# Altium footprint library SVP_Phoenix.PcbLib: 53 footprints (part 3 of 4)
Each footprint in its own frame and in the unit in brackets; x right, y up, seen from the top. Pads: shape width x height; smd on the part's side, far side on the other; paste and mask are expansions set on the pad; w line width, h text height; cw(c..) or ccw(c..) is an arc to the next point about the centre after c.
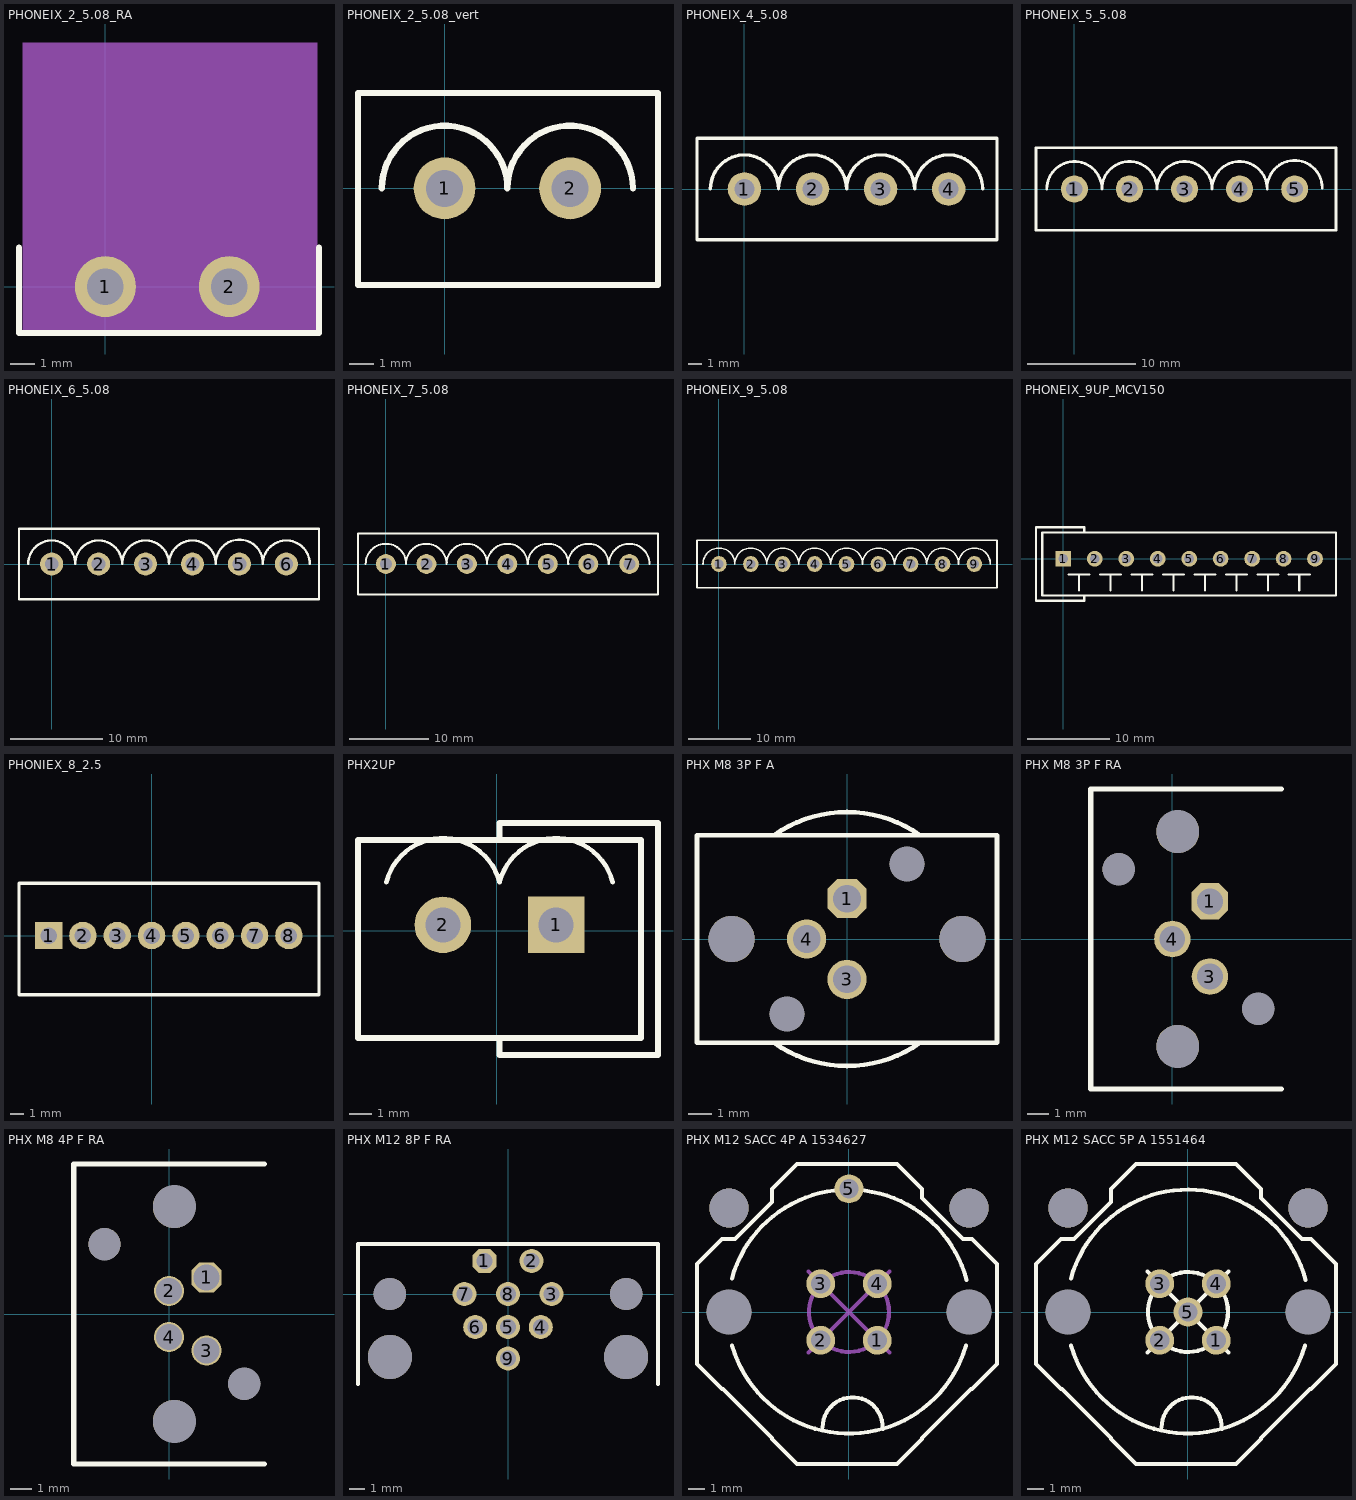
[diagram p2: the footprints below, top view; thin cyan lines are the x and y axes]

## PHONEIX_2_5.08_RA [mm]
height 15
pads (2):
  round 2.5 hole 1.5: 1(0,0) 2(5.08,0)
Top Overlay:
  lines w0.254: -3.54,-1.9 -3.54,1.6 ; -3.5,-1.9 8.7,-1.9 ; 8.76,-1.9 8.76,1.6
Mechanical 1:
  rectangle: -3.4,-2 8.7,10
3D body "1757242.stp": height 8.6, standoff -3.5, extent -3.54,-2.007 8.62,9.996

## PHONEIX_2_5.08_vert [mm]
height 15
pads (2):
  round 2.5 hole 1.5: 1(0,0) 2(5.08,0)
Top Overlay:
  lines w0.254: -2.54,0 cw(c0,0) 2.54,0 cw(c5.08,0) 7.62,0 ; -3.505,-3.912 8.636,-3.912 8.636,3.861 -3.505,3.861 -3.505,-3.912
3D body "1924305.stp": height 12, standoff -3.9, extent -3.515,-4.79 8.645,3.81

## PHONEIX_4_5.08 [mm] "1755752"
height 27.178
pads (4):
  round 2.5 hole 1.5: 1(0,0) 2(5.08,0) 3(10.16,0) 4(15.24,0)
Top Overlay:
  lines w0.254: -2.54,0 cw(c0,0) 2.54,0 cw(c5.08,0) 7.62,0 cw(c10.16,0) 12.7,0 cw(c15.24,0) 17.78,0 ; -3.54,-3.8 -3.54,3.8 18.847,3.8 18.847,-3.8 -3.54,-3.8
3D body "1755752.stp": height 12, standoff -3.9, extent -3.438,-4.815 18.882,3.785

## PHONEIX_5_5.08 [mm]
pads (5):
  round 2.5 hole 1.5: 1(0,0) 2(5.08,0) 3(10.16,0) 4(15.24,0) 5(20.32,0)
Top Overlay:
  lines w0.254: -2.54,0 cw(c0,0) 2.54,0 cw(c5.08,0) 7.62,0 cw(c10.16,0) 12.7,0 cw(c15.24,0) 17.78,0 ; 17.78,0.1 cw(c20.32,0.1) 22.86,0.1 ; -3.54,-3.8 -3.54,3.8 24.13,3.8 24.13,-3.8 -3.54,-3.8
3D body "1755765.stp": height 12, standoff -3.9, extent -3.524,-4.815 23.876,3.785

## PHONEIX_6_5.08 [mm]
pads (6):
  round 2.5 hole 1.5: 1(0,0) 2(5.08,0) 3(10.16,0) 4(15.24,0) 5(20.32,0) 6(25.4,0)
Top Overlay:
  lines w0.254: -2.54,0 cw(c0,0) 2.54,0 cw(c5.08,0) 7.62,0 cw(c10.16,0) 12.7,0 cw(c15.24,0) 17.78,0 ; 17.78,0.1 cw(c20.32,0.1) 22.86,0.1 ; 22.86,0 cw(c25.4,0) 27.94,0 ; -3.54,-3.8 28.94,-3.8 28.94,3.8 -3.54,3.8 -3.54,-3.8
3D body "1755778.stp": height 12, standoff -3.9, extent -3.529,-4.803 28.951,3.797

## PHONEIX_7_5.08 [mm]
pads (7):
  round 2.5 hole 1.5: 1(0,0) 2(5.08,0) 3(10.16,0) 4(15.24,0) 5(20.32,0) 6(25.4,0) 7(30.54,0)
Top Overlay:
  lines w0.254: -2.54,0 cw(c0,0) 2.54,0 ; 2.52,0 cw(c5.06,0) 7.6,0 ; 7.62,0 cw(c10.16,0) 12.7,0 cw(c15.24,0) 17.78,0 ; 17.8,0 cw(c20.34,0) 22.88,0 ; 22.86,0 cw(c25.4,0) 27.94,0 ; 28,0 cw(c30.54,0) 33.08,0 ; -3.5,-1.9 -3.5,-0.95 -3.5,0.95 -3.5,1.9 ; -3.5,-1.9 -3.5,-3.8 34.14,-3.8 34.14,3.8 -3.5,3.8 -3.5,1.9 ; -3.5,-1.9 -3.5,-1.9 ; -3.5,1.9 -3.5,1.9
3D body "1755781.stp": height 12, standoff -3.9, extent -3.56,-4.8 34,3.8

## PHONEIX_9_5.08 [mm]
pads (9):
  round 2.5 hole 1.5: 1(0,0) 2(5.08,0) 3(10.16,0) 4(15.24,0) 5(20.32,0) 6(25.4,0) 7(30.54,0) 8(35.62,0) 9(40.7,0)
Top Overlay:
  lines w0.254: -2.54,0 cw(c0,0) 2.54,0 ; 2.52,0 cw(c5.06,0) 7.6,0 ; 7.62,0 cw(c10.16,0) 12.7,0 cw(c15.24,0) 17.78,0 ; 17.8,0 cw(c20.34,0) 22.88,0 ; 22.86,0 cw(c25.4,0) 27.94,0 ; 28,0 cw(c30.54,0) 33.08,0 ; 33.1,0 cw(c35.64,0) 38.18,0 ; 38.16,0 cw(c40.7,0) 43.24,0 ; -3.5,-1.9 -3.5,-0.95 -3.5,0.95 -3.5,1.9 ; -3.5,-1.9 -3.5,-3.8 44.3,-3.8 44.3,-1.74 44.3,1.74 44.3,3.8 -3.5,3.8 -3.5,1.9 ; -3.5,-1.9 -3.5,-1.9 ; -3.5,1.9 -3.5,1.9
3D body "1755804.stp": height 12, standoff -3.9, extent -3.569,-4.803 44.151,3.797

## PHONEIX_9UP_MCV150 [mil] "9 pin Phoneix conector"
height 100
pads (9):
  rect 75x75 hole 47: 1(0,0)
  round 75 hole 47: 2(150,0) 3(300,0) 4(450,0) 5(600,0) 6(750,0) 7(900,0) 8(1050,0) 9(1200,0)
Top Overlay:
  lines w10: 25,-75 125,-75 ; 75,-150 75,-75 ; 100,-175 100,-200 -130,-200 -130,150 100,150 100,130 ; 175,-75 275,-75 ; 225,-150 225,-75 ; 325,-75 425,-75 ; 375,-150 375,-75 ; 475,-75 575,-75 ; 525,-150 525,-75 ; 625,-75 725,-75 ; 675,-150 675,-75 ; 775,-75 875,-75 ; 825,-150 825,-75 ; 925,-75 1025,-75 ; 975,-150 975,-75 ; 1075,-75 1175,-75 ; 1125,-150 1125,-75 ; -100,-175 -100,125 1300,125 1300,-175 -100,-175

## PHONIEX_8_2.5 [mm]
pads (8):
  rect 2x2 hole 1.2: 1(-7.5,0)
  round 2 hole 1.2: 2(-5,0) 3(-2.5,0) 4(0,0) 5(2.5,0) 6(5,0) 7(7.5,0) 8(10,0)
Top Overlay:
  lines w0.254: -9.652,-4.318 12.192,-4.318 12.192,3.81 -9.652,3.81 -9.652,-4.318
3D body "1881613.stp": height 10.1, standoff -3.5, extent -9.666,-4.29 12.234,3.81

## PHX2UP [mil]
pads (2):
  rect 100x100 hole 62: 1(105,10)
  round 100 hole 62: 2(-95,10)
Top Overlay:
  lines w8: -195.02,84.94 cw(c-95,60) 5.02,84.94 cw(c105,60) 205.02,84.94
  lines w10: 5,-190 5,-220 285,-220 285,190 275,190 5,190 5,160 ; -245,-190 255,-190 255,160 -245,160 -245,-190
3D body "1755736.stp": height 472.44, standoff -153.54, extent -234.37,-178.58 244.37,160

## PHX M8 3P F A [mm] "Phoenix M8 3P F A 1524776"
pads (7):
  oct 1.7x1.7 hole 1.2: 1(0,1.75)
  round 1.7 hole 1.2: 3(0,-1.75) 4(-1.75,0)
  round 2 hole 2 unplated: ""(-5,0) ""(5,0)
  round 1.5 hole 1.5 unplated: ""(-2.6,-3.25) ""(2.6,3.25)
Top Overlay:
  lines w0.203: -3.171,-4.494 ccw(c0,0) 0,-5.5 ccw(c0,0) 3.171,-4.494 ; -3.171,4.494 cw(c0,0) 0,5.5 cw(c0,0) 3.171,4.494 ; -6.5,-4.5 0,-4.5 6.5,-4.5 6.5,0 6.5,4.5 0,4.5 -6.5,4.5 -6.5,0 -6.5,-4.5
3D body "1524776.stp": height 16.51, standoff -3.74, extent -6.504,-5.5 6.503,5.5

## PHX M8 3P F RA [mm] "Phoenix M8 3P F RA 1524788"
pads (7):
  oct 1.7x1.7 hole 1.2: 1(1.75,1.75)
  round 1.7 hole 1.2: 3(1.75,-1.75) 4(0,0)
  round 1.5 hole 1.5 unplated: ""(-2.5,3.25) ""(4,-3.25)
  round 2 hole 2 unplated: ""(0.25,-5) ""(0.25,5)
Top Overlay:
  lines w0.254: 5.08,-6.985 -3.81,-6.985 -3.81,6.985 5.08,6.985
3D body "1524788.stp": height 12.02, standoff -4.48, extent -3.236,-6.574 17.264,6.625

## PHX M8 4P F RA [mm] "Phoenix M8 4P F RA 1526169"
pads (8):
  oct 1.4x1.4 hole 1.2: 1(1.75,1.7)
  round 1.4 hole 1.2: 2(0,1.075) 3(1.75,-1.7) 4(0,-1.075)
  round 1.5 hole 1.5 unplated: ""(-3,3.25) ""(3.5,-3.25)
  round 2 hole 2 unplated: ""(0.25,-5) ""(0.25,5)
Top Overlay:
  lines w0.254: 4.445,-6.985 -4.445,-6.985 -4.445,6.985 4.445,6.985
3D body "1526169.stp": height 12.02, standoff -4.49, extent -3.744,-6.503 16.756,6.505

## PHX M12 8P F RA [mm] "Phoenix M12 8P F RA 1436974"
pads (13):
  oct 1.524x1.524 hole 1: 1(-1.5,2.1)
  round 1.524 hole 1: 2(1.5,2.1) 3(2.77,0) 4(2.08,-2.1) 5(0,-2.1) 6(-2.08,-2.1) 7(-2.77,0) 8(0,0) 9(0,-4.1)
  round 2.8 hole 2.8 unplated: ""(-7.5,-4) ""(7.5,-4)
  round 2.05 hole 2.05 unplated: ""(-7.5,0) ""(7.5,0)
Top Overlay:
  lines w0.254: -9.525,-5.715 -9.525,3.175 9.525,3.175 9.525,-5.715
3D body "1436974.stp": height 16.42, standoff -3.18, extent -9.6,-23.3 9.6,3

## PHX M12 SACC 4P A 1534627 [mm]
pads (9):
  round 1.8 hole 1.2: 1(1.768,-1.768) 2(-1.768,-1.768) 3(-1.768,1.768) 4(1.768,1.768) 5(0,7.7)
  round 2.8 hole 2.8 unplated: ""(-7.5,0) ""(7.5,0)
  round 2.45 hole 2.45 unplated: ""(-7.5,6.5) ""(7.5,6.5)
Top Overlay:
  lines w0.254: -7.322,2.088 cw(c0,0.05) 7.344,2.005 ; -7.303,-2.103 ccw(c0,0) 7.303,-2.104 ; -1.646,-7.204 cw(c0.229,-7.204) 2.104,-7.204 ; -9.5,-3.25 -7.938,-4.812 -7.888,-4.812 -4.812,-7.888 -4.812,-7.938 -3.25,-9.5 3,-9.5 4.563,-7.938 4.563,-7.883 7.634,-4.812 7.687,-4.812 9.25,-3.25 9.25,3 7.687,4.563 7.121,4.563 4.563,7.121 4.563,7.687 3,9.25 -0.75,9.25 -3.25,9.25 -4.812,7.687 -4.812,6.872 -7.121,4.563 -7.938,4.563 -9.5,3 -9.5,-3.25
Mechanical 1:
  circle w0.254: c0,0 r2.5
  lines w0.254: -2.54,-2.54 2.54,2.54 ; -2.54,2.54 2.54,-2.54
3D body "1534627.stp": height 24.01, standoff -5.39, extent -10,-7.5 10,8.5

## PHX M12 SACC 5P A 1551464 [mm]
pads (9):
  round 1.8 hole 1.2: 1(1.768,-1.768) 2(-1.768,-1.768) 3(-1.768,1.768) 4(1.768,1.768) 5(0,0)
  round 2.8 hole 2.8 unplated: ""(-7.5,0) ""(7.5,0)
  round 2.45 hole 2.45 unplated: ""(-7.5,6.5) ""(7.5,6.5)
Top Overlay:
  circle w0.254: c0,0 r2.5
  lines w0.254: -7.322,2.088 cw(c0,0.05) 7.344,2.005 ; -7.303,-2.103 ccw(c0,0) 7.303,-2.104 ; -2.54,-2.54 2.54,2.54 ; -2.54,2.54 2.54,-2.54 ; -1.646,-7.204 cw(c0.229,-7.204) 2.104,-7.204 ; -9.5,-3.25 -9.5,3 -7.938,4.563 -7.121,4.563 -4.812,6.872 -4.812,7.687 -3.25,9.25 -0.75,9.25 3,9.25 4.563,7.687 4.563,7.121 7.121,4.563 7.687,4.563 9.25,3 9.25,-3.25 7.687,-4.812 7.634,-4.812 4.563,-7.883 4.563,-7.938 3,-9.5 -3.25,-9.5 -4.812,-7.938 -4.812,-7.888 -7.888,-4.812 -7.938,-4.812 -9.5,-3.25
3D body "1551464.stp": height 24, standoff -3.5, extent -9.717,-6.834 9.783,8.508